# Altium footprint library BASIC.PcbLib: 244 footprints (part 10 of 16)
Each footprint in its own frame and in the unit in brackets; x right, y up, seen from the top. Pads: shape width x height; smd on the part's side, far side on the other; paste and mask are expansions set on the pad; w line width, h text height; cw(c..) or ccw(c..) is an arc to the next point about the centre after c.
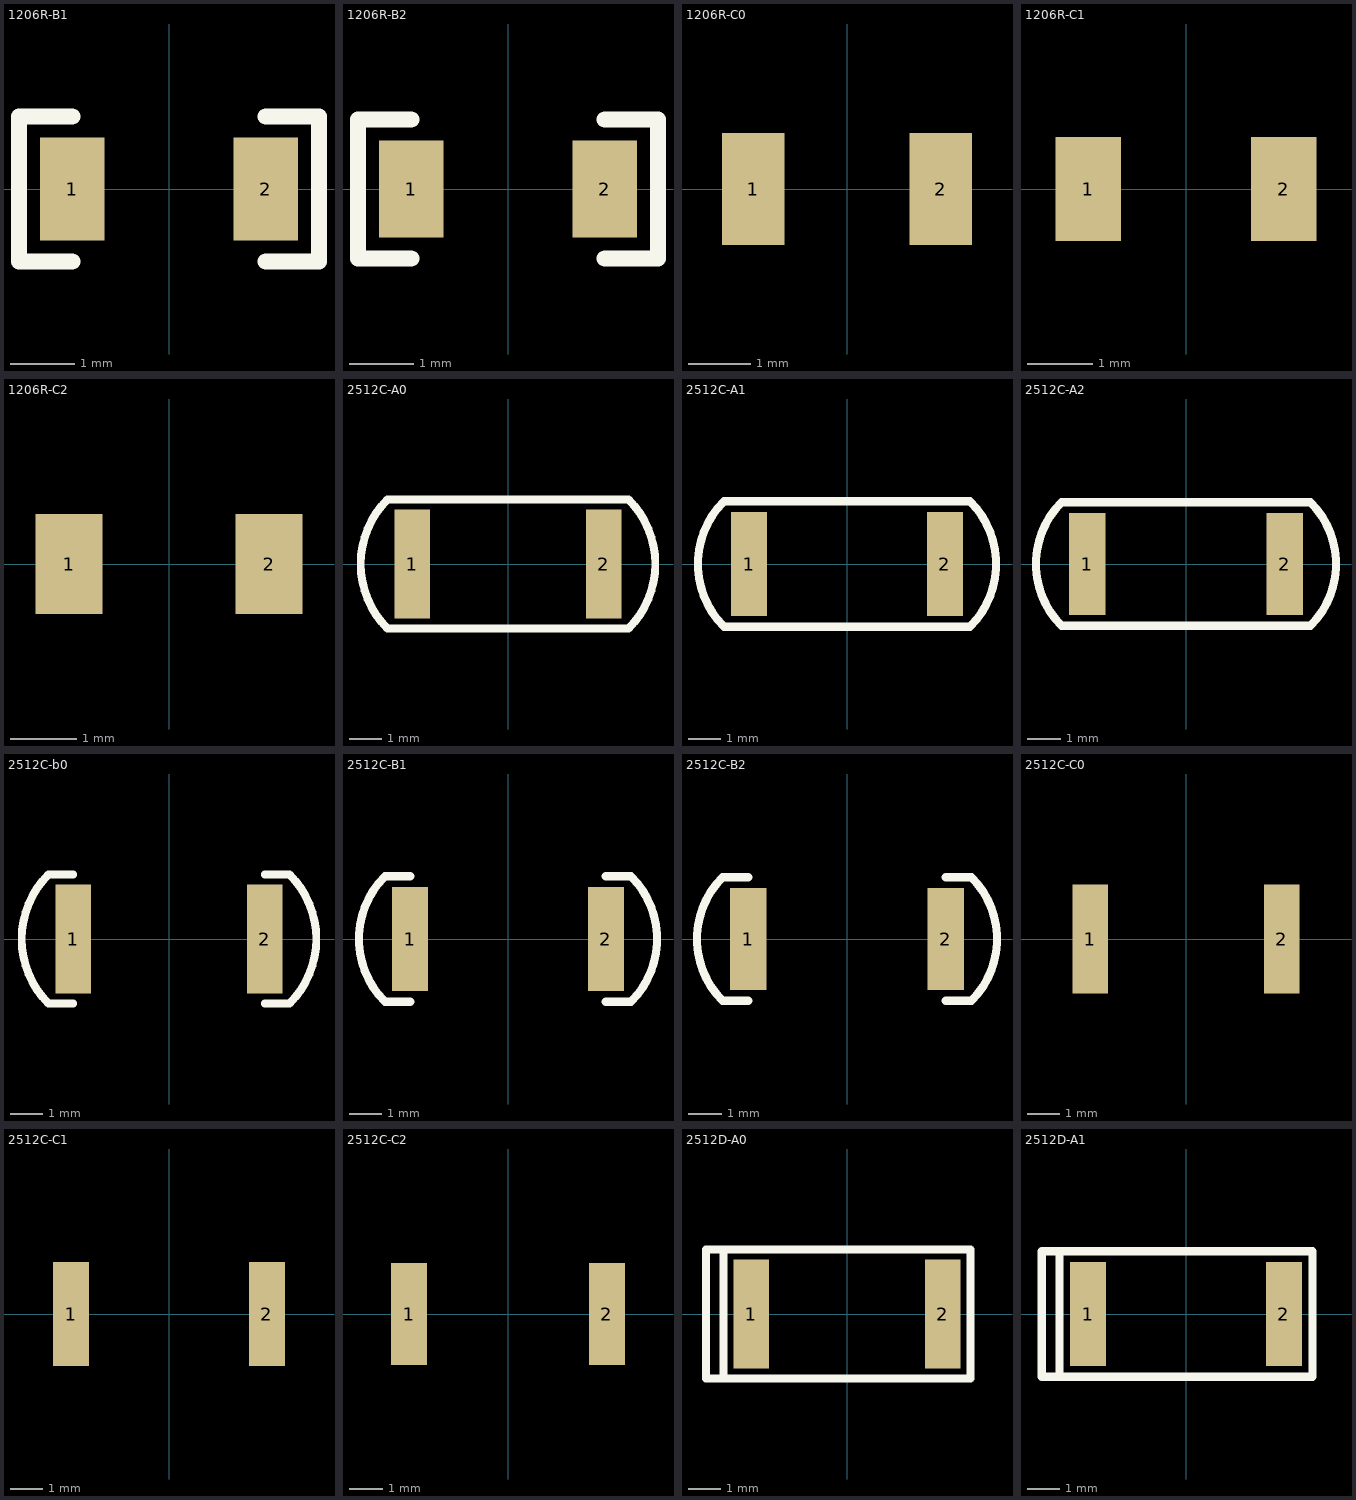
[diagram p9: the footprints below, top view; thin cyan lines are the x and y axes]

## 1206R-B1 [mm]
pads (2):
  rect 1x1.6 smd: 1(-1.5,0) 2(1.5,0)
Top Overlay:
  lines w0.25: -1.5,-1.125 -2.325,-1.125 -2.325,1.125 -1.5,1.125 ; 1.5,-1.125 2.325,-1.125 2.325,1.125 1.5,1.125
3D body "1206R.stp": height 0.6, standoff 0, extent -1.6,-0.8 1.6,0.8

## 1206R-B2 [mm]
pads (2):
  rect 1x1.5 smd: 1(-1.5,0) 2(1.5,0)
Top Overlay:
  lines w0.25: -1.5,-1.075 -2.325,-1.075 -2.325,1.075 -1.5,1.075 ; 1.5,-1.075 2.325,-1.075 2.325,1.075 1.5,1.075
3D body "1206R.stp": height 0.6, standoff 0, extent -1.6,-0.8 1.6,0.8

## 1206R-C0 [mm]
pads (2):
  rect 1x1.8 smd: 1(-1.5,0) 2(1.5,0)
3D body "1206R.stp": height 0.6, standoff 0, extent -1.6,-0.8 1.6,0.8

## 1206R-C1 [mm]
pads (2):
  rect 1x1.6 smd: 1(-1.5,0) 2(1.5,0)
3D body "1206R.stp": height 0.6, standoff 0, extent -1.6,-0.8 1.6,0.8

## 1206R-C2 [mm]
pads (2):
  rect 1x1.5 smd: 1(-1.5,0) 2(1.5,0)
3D body "1206R.stp": height 0.6, standoff 0, extent -1.6,-0.8 1.6,0.8

## 2512C-A0 [mm]
height 0.7
pads (2):
  rect 1.1x3.4 smd: 1(-3,0) 2(3,0)
Top Overlay:
  lines w0.25: -3.775,-2.025 cw(c-1.75,0) -3.775,2.025 3.775,2.025 cw(c1.75,0) 3.775,-2.025 -3.775,-2.025
3D body "RES2512.STEP": height 0.62, standoff 0, extent -3.16,-1.6 3.16,1.6

## 2512C-A1 [mm]
height 0.7
pads (2):
  rect 1.1x3.2 smd: 1(-3,0) 2(3,0)
Top Overlay:
  lines w0.25: -3.775,-1.925 cw(c-1.85,0) -3.775,1.925 3.775,1.925 cw(c1.85,0) 3.775,-1.925 -3.775,-1.925
3D body "RES2512.STEP": height 0.62, standoff 0, extent -3.16,-1.6 3.16,1.6

## 2512C-A2 [mm]
height 0.7
pads (2):
  rect 1.1x3.1 smd: 1(-3,0) 2(3,0)
Top Overlay:
  lines w0.25: -3.775,-1.875 cw(c-1.9,0) -3.775,1.875 3.775,1.875 cw(c1.9,0) 3.775,-1.875 -3.775,-1.875
3D body "RES2512.STEP": height 0.62, standoff 0, extent -3.16,-1.6 3.16,1.6

## 2512C-b0 [mm]
height 0.7
pads (2):
  rect 1.1x3.4 smd: 1(-3,0) 2(3,0)
Top Overlay:
  lines w0.25: -3,-2.025 -3.775,-2.025 cw(c-1.75,0) -3.775,2.025 -3,2.025 ; 3,-2.025 3.775,-2.025 ccw(c1.75,0) 3.775,2.025 3,2.025
3D body "RES2512.STEP": height 0.62, standoff 0, extent -3.16,-1.6 3.16,1.6

## 2512C-B1 [mm]
height 0.7
pads (2):
  rect 1.1x3.2 smd: 1(-3,0) 2(3,0)
Top Overlay:
  lines w0.25: -3,-1.925 -3.775,-1.925 cw(c-1.85,0) -3.775,1.925 -3,1.925 ; 3,-1.925 3.775,-1.925 ccw(c1.85,0) 3.775,1.925 3,1.925
3D body "RES2512.STEP": height 0.62, standoff 0, extent -3.16,-1.6 3.16,1.6

## 2512C-B2 [mm]
height 0.7
pads (2):
  rect 1.1x3.1 smd: 1(-3,0) 2(3,0)
Top Overlay:
  lines w0.25: -3,-1.875 -3.775,-1.875 cw(c-1.9,0) -3.775,1.875 -3,1.875 ; 3,-1.875 3.775,-1.875 ccw(c1.9,0) 3.775,1.875 3,1.875
3D body "RES2512.STEP": height 0.62, standoff 0, extent -3.16,-1.6 3.16,1.6

## 2512C-C0 [mm]
height 0.7
pads (2):
  rect 1.1x3.4 smd: 1(-3,0) 2(3,0)
3D body "RES2512.STEP": height 0.62, standoff 0, extent -3.16,-1.6 3.16,1.6

## 2512C-C1 [mm]
height 0.7
pads (2):
  rect 1.1x3.2 smd: 1(-3,0) 2(3,0)
3D body "RES2512.STEP": height 0.62, standoff 0, extent -3.16,-1.6 3.16,1.6

## 2512C-C2 [mm]
height 0.7
pads (2):
  rect 1.1x3.1 smd: 1(-3,0) 2(3,0)
3D body "RES2512.STEP": height 0.62, standoff 0, extent -3.16,-1.6 3.16,1.6

## 2512D-A0 [mm]
height 0.7
pads (2):
  rect 1.1x3.4 smd: 1(-3,0) 2(3,0)
Top Overlay:
  lines w0.25: -3.925,-2.025 3.875,-2.025 3.875,2.025 -3.925,2.025 ; -4.425,-2.025 -4.425,2.025 -3.875,2.025 -3.875,-2.025 -4.425,-2.025
3D body "RES2512.STEP": height 0.62, standoff 0, extent -3.16,-1.6 3.16,1.6

## 2512D-A1 [mm]
height 0.7
pads (2):
  rect 1.1x3.2 smd: 1(-3,0) 2(3,0)
Top Overlay:
  lines w0.25: -3.925,-1.925 3.875,-1.925 3.875,1.925 -3.925,1.925 ; -4.425,-1.925 -3.875,-1.925 -3.875,1.925 -4.425,1.925 -4.425,-1.925
3D body "RES2512.STEP": height 0.62, standoff 0, extent -3.16,-1.6 3.16,1.6